# Altium schematic symbol library jlcpcb_2025_04_capacitors_extended_0201.schlib: 1175 symbols (part 3 of 7) (continued)
## FN03B221K500PLG
designator C?  Capacitance: 220pF  (hidden comment: *)
Capacitor, Ceramic (MLCC), 220pF, ±10%, 50V, X5R, ±10%, SMD 0201; Manufacturer: PSA(Prosperity Dielectrics); Manufacturer Part Number: FN03B221K500PLG; Package Size: 0201; JLCPCB Basic Part: No; JLCPCB Part Number: C565510; Supplier 1: LCSC; Category: Capacitors - MLCC; Supplier Part Number 1: C565510; Tolerance: ±10%; Voltage Rating: 50V; Temperature Coefficient: X5R; RoHS: Yes; ComponentLink1Description: Datasheet; ComponentLink2Description: JLCPCB Part URL; ComponentLink2URL: https://jlcpcb.com/partdetail/C565510; ComponentLink3Description: LCSC Part URL; ComponentLink3URL: https://lcsc.com/product-detail/Multilayer-Ceramic-Capacitors-MLCC---SMD-SMT_PSAProsperity-Dielectrics-PSAProsperity-Dielectrics-FN03B221K500PLG_C565510.html
footprint CAP-0201 (0201 (0603M) Capacitor)
pins: 1, 2

## FN03B331K160PLG
designator C?  Capacitance: 330pF  (hidden comment: *)
Capacitor, Ceramic (MLCC), 330pF, ±10%, 16V, X5R, ±10%, SMD 0201; Manufacturer: PSA(Prosperity Dielectrics); Manufacturer Part Number: FN03B331K160PLG; Package Size: 0201; JLCPCB Basic Part: No; JLCPCB Part Number: C565511; Supplier 1: LCSC; Category: Capacitors - MLCC; Supplier Part Number 1: C565511; Tolerance: ±10%; Voltage Rating: 16V; Temperature Coefficient: X5R; RoHS: Yes; ComponentLink1Description: Datasheet; ComponentLink2Description: JLCPCB Part URL; ComponentLink2URL: https://jlcpcb.com/partdetail/C565511; ComponentLink3Description: LCSC Part URL; ComponentLink3URL: https://lcsc.com/product-detail/Multilayer-Ceramic-Capacitors-MLCC---SMD-SMT_PSAProsperity-Dielectrics-PSAProsperity-Dielectrics-FN03B331K160PLG_C565511.html
footprint CAP-0201 (0201 (0603M) Capacitor)
pins: 1, 2

## FN03B331K250PLG
designator C?  Capacitance: 330pF  (hidden comment: *)
Capacitor, Ceramic (MLCC), 330pF, ±10%, 25V, X5R, ±10%, SMD 0201; Manufacturer: PSA(Prosperity Dielectrics); Manufacturer Part Number: FN03B331K250PLG; Package Size: 0201; JLCPCB Basic Part: No; JLCPCB Part Number: C565512; Supplier 1: LCSC; Category: Capacitors - MLCC; Supplier Part Number 1: C565512; Tolerance: ±10%; Voltage Rating: 25V; Temperature Coefficient: X5R; RoHS: Yes; ComponentLink1Description: Datasheet; ComponentLink2Description: JLCPCB Part URL; ComponentLink2URL: https://jlcpcb.com/partdetail/C565512; ComponentLink3Description: LCSC Part URL; ComponentLink3URL: https://lcsc.com/product-detail/Multilayer-Ceramic-Capacitors-MLCC---SMD-SMT_PSAProsperity-Dielectrics-PSAProsperity-Dielectrics-FN03B331K250PLG_C565512.html
footprint CAP-0201 (0201 (0603M) Capacitor)
pins: 1, 2

## FN03B331K500PLG
designator C?  Capacitance: 330pF  (hidden comment: *)
Capacitor, Ceramic (MLCC), 330pF, ±10%, 50V, X5R, ±10%, SMD 0201; Manufacturer: PSA(Prosperity Dielectrics); Manufacturer Part Number: FN03B331K500PLG; Package Size: 0201; JLCPCB Basic Part: No; JLCPCB Part Number: C565513; Supplier 1: LCSC; Category: Capacitors - MLCC; Supplier Part Number 1: C565513; Tolerance: ±10%; Voltage Rating: 50V; Temperature Coefficient: X5R; RoHS: Yes; ComponentLink1Description: Datasheet; ComponentLink2Description: JLCPCB Part URL; ComponentLink2URL: https://jlcpcb.com/partdetail/C565513; ComponentLink3Description: LCSC Part URL; ComponentLink3URL: https://lcsc.com/product-detail/Multilayer-Ceramic-Capacitors-MLCC---SMD-SMT_PSAProsperity-Dielectrics-PSAProsperity-Dielectrics-FN03B331K500PLG_C565513.html
footprint CAP-0201 (0201 (0603M) Capacitor)
pins: 1, 2

## FN03B332K100PLG
designator C?  Capacitance: 3.3nF  (hidden comment: *)
Capacitor, Ceramic (MLCC), 3.3nF, ±10%, 10V, ±10%, SMD 0201; Manufacturer: PSA(Prosperity Dielectrics); Manufacturer Part Number: FN03B332K100PLG; Package Size: 0201; JLCPCB Basic Part: No; JLCPCB Part Number: C565514; Supplier 1: LCSC; Category: Capacitors - MLCC; Supplier Part Number 1: C565514; Tolerance: ±10%; Voltage Rating: 10V; RoHS: Yes; ComponentLink1Description: Datasheet; ComponentLink2Description: JLCPCB Part URL; ComponentLink2URL: https://jlcpcb.com/partdetail/C565514; ComponentLink3Description: LCSC Part URL; ComponentLink3URL: https://lcsc.com/product-detail/Multilayer-Ceramic-Capacitors-MLCC---SMD-SMT_PSAProsperity-Dielectrics-PSAProsperity-Dielectrics-FN03B332K100PLG_C565514.html
footprint CAP-0201 (0201 (0603M) Capacitor)
pins: 1, 2

## FN03B332K160PLG
designator C?  Capacitance: 3.3nF  (hidden comment: *)
Capacitor, Ceramic (MLCC), 3.3nF, ±10%, 16V, ±10%, SMD 0201; Manufacturer: PSA(Prosperity Dielectrics); Manufacturer Part Number: FN03B332K160PLG; Package Size: 0201; JLCPCB Basic Part: No; JLCPCB Part Number: C565515; Supplier 1: LCSC; Category: Capacitors - MLCC; Supplier Part Number 1: C565515; Tolerance: ±10%; Voltage Rating: 16V; RoHS: Yes; ComponentLink1Description: Datasheet; ComponentLink2Description: JLCPCB Part URL; ComponentLink2URL: https://jlcpcb.com/partdetail/C565515; ComponentLink3Description: LCSC Part URL; ComponentLink3URL: https://lcsc.com/product-detail/Multilayer-Ceramic-Capacitors-MLCC---SMD-SMT_PSAProsperity-Dielectrics-PSAProsperity-Dielectrics-FN03B332K160PLG_C565515.html
footprint CAP-0201 (0201 (0603M) Capacitor)
pins: 1, 2

## FN03B333K100PLG
designator C?  Capacitance: 33nF  (hidden comment: *)
Capacitor, Ceramic (MLCC), 33nF, ±10%, 10V, ±10%, SMD 0201; Manufacturer: PSA(Prosperity Dielectrics); Manufacturer Part Number: FN03B333K100PLG; Package Size: 0201; JLCPCB Basic Part: No; JLCPCB Part Number: C565516; Supplier 1: LCSC; Category: Capacitors - MLCC; Supplier Part Number 1: C565516; Tolerance: ±10%; Voltage Rating: 10V; RoHS: Yes; ComponentLink1Description: Datasheet; ComponentLink2Description: JLCPCB Part URL; ComponentLink2URL: https://jlcpcb.com/partdetail/C565516; ComponentLink3Description: LCSC Part URL; ComponentLink3URL: https://lcsc.com/product-detail/Multilayer-Ceramic-Capacitors-MLCC---SMD-SMT_PSAProsperity-Dielectrics-PSAProsperity-Dielectrics-FN03B333K100PLG_C565516.html
footprint CAP-0201 (0201 (0603M) Capacitor)
pins: 1, 2

## FN03B471K160PLG
designator C?  Capacitance: 470pF  (hidden comment: *)
Capacitor, Ceramic (MLCC), 470pF, ±10%, 16V, X5R, ±10%, SMD 0201; Manufacturer: PSA(Prosperity Dielectrics); Manufacturer Part Number: FN03B471K160PLG; Package Size: 0201; JLCPCB Basic Part: No; JLCPCB Part Number: C565518; Supplier 1: LCSC; Category: Capacitors - MLCC; Supplier Part Number 1: C565518; Tolerance: ±10%; Voltage Rating: 16V; Temperature Coefficient: X5R; RoHS: Yes; ComponentLink1Description: Datasheet; ComponentLink2Description: JLCPCB Part URL; ComponentLink2URL: https://jlcpcb.com/partdetail/C565518; ComponentLink3Description: LCSC Part URL; ComponentLink3URL: https://lcsc.com/product-detail/Multilayer-Ceramic-Capacitors-MLCC---SMD-SMT_PSAProsperity-Dielectrics-PSAProsperity-Dielectrics-FN03B471K160PLG_C565518.html
footprint CAP-0201 (0201 (0603M) Capacitor)
pins: 1, 2

## FN03B471K250PLG
designator C?  Capacitance: 470pF  (hidden comment: *)
Capacitor, Ceramic (MLCC), 470pF, ±10%, 25V, X5R, ±10%, SMD 0201; Manufacturer: PSA(Prosperity Dielectrics); Manufacturer Part Number: FN03B471K250PLG; Package Size: 0201; JLCPCB Basic Part: No; JLCPCB Part Number: C565519; Supplier 1: LCSC; Category: Capacitors - MLCC; Supplier Part Number 1: C565519; Tolerance: ±10%; Voltage Rating: 25V; Temperature Coefficient: X5R; RoHS: Yes; ComponentLink1Description: Datasheet; ComponentLink2Description: JLCPCB Part URL; ComponentLink2URL: https://jlcpcb.com/partdetail/C565519; ComponentLink3Description: LCSC Part URL; ComponentLink3URL: https://lcsc.com/product-detail/Multilayer-Ceramic-Capacitors-MLCC---SMD-SMT_PSAProsperity-Dielectrics-PSAProsperity-Dielectrics-FN03B471K250PLG_C565519.html
footprint CAP-0201 (0201 (0603M) Capacitor)
pins: 1, 2

## FN03B471K500PLG
designator C?  Capacitance: 470pF  (hidden comment: *)
Capacitor, Ceramic (MLCC), 470pF, ±10%, 50V, X5R, ±10%, SMD 0201; Manufacturer: PSA(Prosperity Dielectrics); Manufacturer Part Number: FN03B471K500PLG; Package Size: 0201; JLCPCB Basic Part: No; JLCPCB Part Number: C565520; Supplier 1: LCSC; Category: Capacitors - MLCC; Supplier Part Number 1: C565520; Tolerance: ±10%; Voltage Rating: 50V; Temperature Coefficient: X5R; RoHS: Yes; ComponentLink1Description: Datasheet; ComponentLink2Description: JLCPCB Part URL; ComponentLink2URL: https://jlcpcb.com/partdetail/C565520; ComponentLink3Description: LCSC Part URL; ComponentLink3URL: https://lcsc.com/product-detail/Multilayer-Ceramic-Capacitors-MLCC---SMD-SMT_PSAProsperity-Dielectrics-PSAProsperity-Dielectrics-FN03B471K500PLG_C565520.html
footprint CAP-0201 (0201 (0603M) Capacitor)
pins: 1, 2

## FN03B472K100PLG
designator C?  Capacitance: 4.7nF  (hidden comment: *)
Capacitor, Ceramic (MLCC), 4.7nF, ±10%, 10V, X5R, ±10%, SMD 0201; Manufacturer: PSA(Prosperity Dielectrics); Manufacturer Part Number: FN03B472K100PLG; Package Size: 0201; JLCPCB Basic Part: No; JLCPCB Part Number: C565521; Supplier 1: LCSC; Category: Capacitors - MLCC; Supplier Part Number 1: C565521; Tolerance: ±10%; Voltage Rating: 10V; Temperature Coefficient: X5R; RoHS: Yes; ComponentLink1Description: Datasheet; ComponentLink2Description: JLCPCB Part URL; ComponentLink2URL: https://jlcpcb.com/partdetail/C565521; ComponentLink3Description: LCSC Part URL; ComponentLink3URL: https://lcsc.com/product-detail/Multilayer-Ceramic-Capacitors-MLCC---SMD-SMT_PSAProsperity-Dielectrics-PSAProsperity-Dielectrics-FN03B472K100PLG_C565521.html
footprint CAP-0201 (0201 (0603M) Capacitor)
pins: 1, 2

## FN03B472K160PLG
designator C?  Capacitance: 4.7nF  (hidden comment: *)
Capacitor, Ceramic (MLCC), 4.7nF, ±10%, 16V, X5R, ±10%, SMD 0201; Manufacturer: PSA(Prosperity Dielectrics); Manufacturer Part Number: FN03B472K160PLG; Package Size: 0201; JLCPCB Basic Part: No; JLCPCB Part Number: C565522; Supplier 1: LCSC; Category: Capacitors - MLCC; Supplier Part Number 1: C565522; Tolerance: ±10%; Voltage Rating: 16V; Temperature Coefficient: X5R; RoHS: Yes; ComponentLink1Description: Datasheet; ComponentLink2Description: JLCPCB Part URL; ComponentLink2URL: https://jlcpcb.com/partdetail/C565522; ComponentLink3Description: LCSC Part URL; ComponentLink3URL: https://lcsc.com/product-detail/Multilayer-Ceramic-Capacitors-MLCC---SMD-SMT_PSAProsperity-Dielectrics-PSAProsperity-Dielectrics-FN03B472K160PLG_C565522.html
footprint CAP-0201 (0201 (0603M) Capacitor)
pins: 1, 2

## FN03B472K250PLG
designator C?  Capacitance: 4.7nF  (hidden comment: *)
Capacitor, Ceramic (MLCC), 4.7nF, ±10%, 25V, X5R, ±10%, SMD 0201; Manufacturer: PSA(Prosperity Dielectrics); Manufacturer Part Number: FN03B472K250PLG; Package Size: 0201; JLCPCB Basic Part: No; JLCPCB Part Number: C565523; Supplier 1: LCSC; Category: Capacitors - MLCC; Supplier Part Number 1: C565523; Tolerance: ±10%; Voltage Rating: 25V; Temperature Coefficient: X5R; RoHS: Yes; ComponentLink1Description: Datasheet; ComponentLink2Description: JLCPCB Part URL; ComponentLink2URL: https://jlcpcb.com/partdetail/C565523; ComponentLink3Description: LCSC Part URL; ComponentLink3URL: https://lcsc.com/product-detail/Multilayer-Ceramic-Capacitors-MLCC---SMD-SMT_PSAProsperity-Dielectrics-PSAProsperity-Dielectrics-FN03B472K250PLG_C565523.html
footprint CAP-0201 (0201 (0603M) Capacitor)
pins: 1, 2

## FN03B473K6R3PLG
designator C?  Capacitance: 47nF  (hidden comment: *)
Capacitor, Ceramic (MLCC), 47nF, ±10%, 6.3V, ±10%, SMD 0201; Manufacturer: PSA(Prosperity Dielectrics); Manufacturer Part Number: FN03B473K6R3PLG; Package Size: 0201; JLCPCB Basic Part: No; JLCPCB Part Number: C565524; Supplier 1: LCSC; Category: Capacitors - MLCC; Supplier Part Number 1: C565524; Tolerance: ±10%; Voltage Rating: 6.3V; RoHS: Yes; ComponentLink1Description: Datasheet; ComponentLink2Description: JLCPCB Part URL; ComponentLink2URL: https://jlcpcb.com/partdetail/C565524; ComponentLink3Description: LCSC Part URL; ComponentLink3URL: https://lcsc.com/product-detail/Multilayer-Ceramic-Capacitors-MLCC---SMD-SMT_PSAProsperity-Dielectrics-PSAProsperity-Dielectrics-FN03B473K6R3PLG_C565524.html
footprint CAP-0201 (0201 (0603M) Capacitor)
pins: 1, 2

## FN03N1R0B500PLG
designator C?  Capacitance: 1pF  (hidden comment: *)
Capacitor, Ceramic (MLCC), 1pF, 50V, NP0, SMD 0201; Manufacturer: PSA(Prosperity Dielectrics); Manufacturer Part Number: FN03N1R0B500PLG; Package Size: 0201; JLCPCB Basic Part: No; JLCPCB Part Number: C565473; Supplier 1: LCSC; Category: Capacitors - MLCC; Supplier Part Number 1: C565473; Voltage Rating: 50V; Temperature Coefficient: NP0; RoHS: Yes; ComponentLink1Description: Datasheet; ComponentLink2Description: JLCPCB Part URL; ComponentLink2URL: https://jlcpcb.com/partdetail/C565473; ComponentLink3Description: LCSC Part URL; ComponentLink3URL: https://lcsc.com/product-detail/Multilayer-Ceramic-Capacitors-MLCC---SMD-SMT_PSAProsperity-Dielectrics-PSAProsperity-Dielectrics-FN03N1R0B500PLG_C565473.html
footprint CAP-0201 (0201 (0603M) Capacitor)
pins: 1, 2

## FN03N1R0C500PLG
designator C?  Capacitance: 1pF  (hidden comment: *)
Capacitor, Ceramic (MLCC), 1pF, 50V, C0G, SMD 0201; Manufacturer: PSA(Prosperity Dielectrics); Manufacturer Part Number: FN03N1R0C500PLG; Package Size: 0201; JLCPCB Basic Part: No; JLCPCB Part Number: C561698; Supplier 1: LCSC; Category: Capacitors - MLCC; Supplier Part Number 1: C561698; Voltage Rating: 50V; Temperature Coefficient: C0G; RoHS: Yes; ComponentLink1Description: Datasheet; ComponentLink2Description: JLCPCB Part URL; ComponentLink2URL: https://jlcpcb.com/partdetail/C561698; ComponentLink3Description: LCSC Part URL; ComponentLink3URL: https://lcsc.com/product-detail/Multilayer-Ceramic-Capacitors-MLCC---SMD-SMT_PSAProsperity-Dielectrics-PSAProsperity-Dielectrics-FN03N1R0C500PLG_C561698.html
footprint CAP-0201 (0201 (0603M) Capacitor)
pins: 1, 2

## FN03N1R2B500PLG
designator C?  Capacitance: 1.2pF  (hidden comment: *)
Capacitor, Ceramic (MLCC), 1.2pF, 50V, NP0, SMD 0201; Manufacturer: PSA(Prosperity Dielectrics); Manufacturer Part Number: FN03N1R2B500PLG; Package Size: 0201; JLCPCB Basic Part: No; JLCPCB Part Number: C565474; Supplier 1: LCSC; Category: Capacitors - MLCC; Supplier Part Number 1: C565474; Voltage Rating: 50V; Temperature Coefficient: NP0; RoHS: Yes; ComponentLink1Description: Datasheet; ComponentLink2Description: JLCPCB Part URL; ComponentLink2URL: https://jlcpcb.com/partdetail/C565474; ComponentLink3Description: LCSC Part URL; ComponentLink3URL: https://lcsc.com/product-detail/Multilayer-Ceramic-Capacitors-MLCC---SMD-SMT_PSAProsperity-Dielectrics-PSAProsperity-Dielectrics-FN03N1R2B500PLG_C565474.html
footprint CAP-0201 (0201 (0603M) Capacitor)
pins: 1, 2

## FN03N1R2C500PLG
designator C?  Capacitance: 1.2pF  (hidden comment: *)
Capacitor, Ceramic (MLCC), 1.2pF, 50V, C0G, SMD 0201; Manufacturer: PSA(Prosperity Dielectrics); Manufacturer Part Number: FN03N1R2C500PLG; Package Size: 0201; JLCPCB Basic Part: No; JLCPCB Part Number: C561699; Supplier 1: LCSC; Category: Capacitors - MLCC; Supplier Part Number 1: C561699; Voltage Rating: 50V; Temperature Coefficient: C0G; RoHS: Yes; ComponentLink1Description: Datasheet; ComponentLink2Description: JLCPCB Part URL; ComponentLink2URL: https://jlcpcb.com/partdetail/C561699; ComponentLink3Description: LCSC Part URL; ComponentLink3URL: https://lcsc.com/product-detail/Multilayer-Ceramic-Capacitors-MLCC---SMD-SMT_PSAProsperity-Dielectrics-PSAProsperity-Dielectrics-FN03N1R2C500PLG_C561699.html
footprint CAP-0201 (0201 (0603M) Capacitor)
pins: 1, 2

## FN03N1R5B500PLG
designator C?  Capacitance: 1.5pF  (hidden comment: *)
Capacitor, Ceramic (MLCC), 1.5pF, 50V, SMD 0201; Manufacturer: PSA(Prosperity Dielectrics); Manufacturer Part Number: FN03N1R5B500PLG; Package Size: 0201; JLCPCB Basic Part: No; JLCPCB Part Number: C565475; Supplier 1: LCSC; Category: Capacitors - MLCC; Supplier Part Number 1: C565475; Voltage Rating: 50V; RoHS: Yes; ComponentLink1Description: Datasheet; ComponentLink2Description: JLCPCB Part URL; ComponentLink2URL: https://jlcpcb.com/partdetail/C565475; ComponentLink3Description: LCSC Part URL; ComponentLink3URL: https://lcsc.com/product-detail/Multilayer-Ceramic-Capacitors-MLCC---SMD-SMT_PSAProsperity-Dielectrics-PSAProsperity-Dielectrics-FN03N1R5B500PLG_C565475.html
footprint CAP-0201 (0201 (0603M) Capacitor)
pins: 1, 2

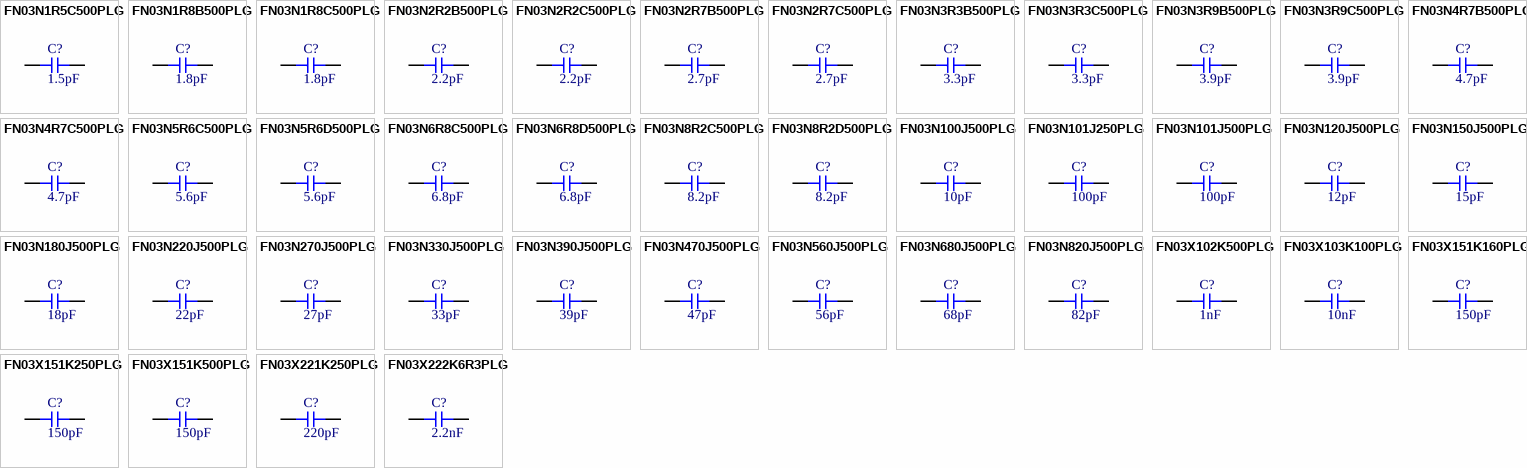
[diagram p12: symbols FN03N1R5C500PLG to FN03X222K6R3PLG]

## FN03N1R5C500PLG
designator C?  Capacitance: 1.5pF  (hidden comment: *)
Capacitor, Ceramic (MLCC), 1.5pF, 50V, NP0, SMD 0201; Manufacturer: PSA(Prosperity Dielectrics); Manufacturer Part Number: FN03N1R5C500PLG; Package Size: 0201; JLCPCB Basic Part: No; JLCPCB Part Number: C561700; Supplier 1: LCSC; Category: Capacitors - MLCC; Supplier Part Number 1: C561700; Voltage Rating: 50V; Temperature Coefficient: NP0; RoHS: Yes; ComponentLink1Description: Datasheet; ComponentLink2Description: JLCPCB Part URL; ComponentLink2URL: https://jlcpcb.com/partdetail/C561700; ComponentLink3Description: LCSC Part URL; ComponentLink3URL: https://lcsc.com/product-detail/Multilayer-Ceramic-Capacitors-MLCC---SMD-SMT_PSAProsperity-Dielectrics-PSAProsperity-Dielectrics-FN03N1R5C500PLG_C561700.html
footprint CAP-0201 (0201 (0603M) Capacitor)
pins: 1, 2

## FN03N1R8B500PLG
designator C?  Capacitance: 1.8pF  (hidden comment: *)
Capacitor, Ceramic (MLCC), 1.8pF, 50V, SMD 0201; Manufacturer: PSA(Prosperity Dielectrics); Manufacturer Part Number: FN03N1R8B500PLG; Package Size: 0201; JLCPCB Basic Part: No; JLCPCB Part Number: C565476; Supplier 1: LCSC; Category: Capacitors - MLCC; Supplier Part Number 1: C565476; Voltage Rating: 50V; RoHS: Yes; ComponentLink1Description: Datasheet; ComponentLink2Description: JLCPCB Part URL; ComponentLink2URL: https://jlcpcb.com/partdetail/C565476; ComponentLink3Description: LCSC Part URL; ComponentLink3URL: https://lcsc.com/product-detail/Multilayer-Ceramic-Capacitors-MLCC---SMD-SMT_PSAProsperity-Dielectrics-PSAProsperity-Dielectrics-FN03N1R8B500PLG_C565476.html
footprint CAP-0201 (0201 (0603M) Capacitor)
pins: 1, 2

## FN03N1R8C500PLG
designator C?  Capacitance: 1.8pF  (hidden comment: *)
Capacitor, Ceramic (MLCC), 1.8pF, 50V, C0G, SMD 0201; Manufacturer: PSA(Prosperity Dielectrics); Manufacturer Part Number: FN03N1R8C500PLG; Package Size: 0201; JLCPCB Basic Part: No; JLCPCB Part Number: C561701; Supplier 1: LCSC; Category: Capacitors - MLCC; Supplier Part Number 1: C561701; Voltage Rating: 50V; Temperature Coefficient: C0G; RoHS: Yes; ComponentLink1Description: Datasheet; ComponentLink2Description: JLCPCB Part URL; ComponentLink2URL: https://jlcpcb.com/partdetail/C561701; ComponentLink3Description: LCSC Part URL; ComponentLink3URL: https://lcsc.com/product-detail/Multilayer-Ceramic-Capacitors-MLCC---SMD-SMT_PSAProsperity-Dielectrics-PSAProsperity-Dielectrics-FN03N1R8C500PLG_C561701.html
footprint CAP-0201 (0201 (0603M) Capacitor)
pins: 1, 2

## FN03N2R2B500PLG
designator C?  Capacitance: 2.2pF  (hidden comment: *)
Capacitor, Ceramic (MLCC), 2.2pF, 50V, NP0, SMD 0201; Manufacturer: PSA(Prosperity Dielectrics); Manufacturer Part Number: FN03N2R2B500PLG; Package Size: 0201; JLCPCB Basic Part: No; JLCPCB Part Number: C565477; Supplier 1: LCSC; Category: Capacitors - MLCC; Supplier Part Number 1: C565477; Voltage Rating: 50V; Temperature Coefficient: NP0; RoHS: Yes; ComponentLink1Description: Datasheet; ComponentLink2Description: JLCPCB Part URL; ComponentLink2URL: https://jlcpcb.com/partdetail/C565477; ComponentLink3Description: LCSC Part URL; ComponentLink3URL: https://lcsc.com/product-detail/Multilayer-Ceramic-Capacitors-MLCC---SMD-SMT_PSAProsperity-Dielectrics-PSAProsperity-Dielectrics-FN03N2R2B500PLG_C565477.html
footprint CAP-0201 (0201 (0603M) Capacitor)
pins: 1, 2

## FN03N2R2C500PLG
designator C?  Capacitance: 2.2pF  (hidden comment: *)
Capacitor, Ceramic (MLCC), 2.2pF, 50V, NP0, SMD 0201; Manufacturer: PSA(Prosperity Dielectrics); Manufacturer Part Number: FN03N2R2C500PLG; Package Size: 0201; JLCPCB Basic Part: No; JLCPCB Part Number: C561702; Supplier 1: LCSC; Category: Capacitors - MLCC; Supplier Part Number 1: C561702; Voltage Rating: 50V; Temperature Coefficient: NP0; RoHS: Yes; ComponentLink1Description: Datasheet; ComponentLink2Description: JLCPCB Part URL; ComponentLink2URL: https://jlcpcb.com/partdetail/C561702; ComponentLink3Description: LCSC Part URL; ComponentLink3URL: https://lcsc.com/product-detail/Multilayer-Ceramic-Capacitors-MLCC---SMD-SMT_PSAProsperity-Dielectrics-PSAProsperity-Dielectrics-FN03N2R2C500PLG_C561702.html
footprint CAP-0201 (0201 (0603M) Capacitor)
pins: 1, 2

## FN03N2R7B500PLG
designator C?  Capacitance: 2.7pF  (hidden comment: *)
Capacitor, Ceramic (MLCC), 2.7pF, 50V, C0G, SMD 0201; Manufacturer: PSA(Prosperity Dielectrics); Manufacturer Part Number: FN03N2R7B500PLG; Package Size: 0201; JLCPCB Basic Part: No; JLCPCB Part Number: C565478; Supplier 1: LCSC; Category: Capacitors - MLCC; Supplier Part Number 1: C565478; Voltage Rating: 50V; Temperature Coefficient: C0G; RoHS: Yes; ComponentLink1Description: Datasheet; ComponentLink2Description: JLCPCB Part URL; ComponentLink2URL: https://jlcpcb.com/partdetail/C565478; ComponentLink3Description: LCSC Part URL; ComponentLink3URL: https://lcsc.com/product-detail/Multilayer-Ceramic-Capacitors-MLCC---SMD-SMT_PSAProsperity-Dielectrics-PSAProsperity-Dielectrics-FN03N2R7B500PLG_C565478.html
footprint CAP-0201 (0201 (0603M) Capacitor)
pins: 1, 2

## FN03N2R7C500PLG
designator C?  Capacitance: 2.7pF  (hidden comment: *)
Capacitor, Ceramic (MLCC), 2.7pF, 50V, C0G, SMD 0201; Manufacturer: PSA(Prosperity Dielectrics); Manufacturer Part Number: FN03N2R7C500PLG; Package Size: 0201; JLCPCB Basic Part: No; JLCPCB Part Number: C561703; Supplier 1: LCSC; Category: Capacitors - MLCC; Supplier Part Number 1: C561703; Voltage Rating: 50V; Temperature Coefficient: C0G; RoHS: Yes; ComponentLink1Description: Datasheet; ComponentLink2Description: JLCPCB Part URL; ComponentLink2URL: https://jlcpcb.com/partdetail/C561703; ComponentLink3Description: LCSC Part URL; ComponentLink3URL: https://lcsc.com/product-detail/Multilayer-Ceramic-Capacitors-MLCC---SMD-SMT_PSAProsperity-Dielectrics-PSAProsperity-Dielectrics-FN03N2R7C500PLG_C561703.html
footprint CAP-0201 (0201 (0603M) Capacitor)
pins: 1, 2

## FN03N3R3B500PLG
designator C?  Capacitance: 3.3pF  (hidden comment: *)
Capacitor, Ceramic (MLCC), 3.3pF, 50V, C0G, SMD 0201; Manufacturer: PSA(Prosperity Dielectrics); Manufacturer Part Number: FN03N3R3B500PLG; Package Size: 0201; JLCPCB Basic Part: No; JLCPCB Part Number: C565479; Supplier 1: LCSC; Category: Capacitors - MLCC; Supplier Part Number 1: C565479; Voltage Rating: 50V; Temperature Coefficient: C0G; RoHS: Yes; ComponentLink1Description: Datasheet; ComponentLink2Description: JLCPCB Part URL; ComponentLink2URL: https://jlcpcb.com/partdetail/C565479; ComponentLink3Description: LCSC Part URL; ComponentLink3URL: https://lcsc.com/product-detail/Multilayer-Ceramic-Capacitors-MLCC---SMD-SMT_PSAProsperity-Dielectrics-PSAProsperity-Dielectrics-FN03N3R3B500PLG_C565479.html
footprint CAP-0201 (0201 (0603M) Capacitor)
pins: 1, 2

## FN03N3R3C500PLG
designator C?  Capacitance: 3.3pF  (hidden comment: *)
Capacitor, Ceramic (MLCC), 3.3pF, 50V, C0G, SMD 0201; Manufacturer: PSA(Prosperity Dielectrics); Manufacturer Part Number: FN03N3R3C500PLG; Package Size: 0201; JLCPCB Basic Part: No; JLCPCB Part Number: C561704; Supplier 1: LCSC; Category: Capacitors - MLCC; Supplier Part Number 1: C561704; Voltage Rating: 50V; Temperature Coefficient: C0G; RoHS: Yes; ComponentLink1Description: Datasheet; ComponentLink2Description: JLCPCB Part URL; ComponentLink2URL: https://jlcpcb.com/partdetail/C561704; ComponentLink3Description: LCSC Part URL; ComponentLink3URL: https://lcsc.com/product-detail/Multilayer-Ceramic-Capacitors-MLCC---SMD-SMT_PSAProsperity-Dielectrics-PSAProsperity-Dielectrics-FN03N3R3C500PLG_C561704.html
footprint CAP-0201 (0201 (0603M) Capacitor)
pins: 1, 2

## FN03N3R9B500PLG
designator C?  Capacitance: 3.9pF  (hidden comment: *)
Capacitor, Ceramic (MLCC), 3.9pF, 50V, SMD 0201; Manufacturer: PSA(Prosperity Dielectrics); Manufacturer Part Number: FN03N3R9B500PLG; Package Size: 0201; JLCPCB Basic Part: No; JLCPCB Part Number: C565480; Supplier 1: LCSC; Category: Capacitors - MLCC; Supplier Part Number 1: C565480; Voltage Rating: 50V; RoHS: Yes; ComponentLink1Description: Datasheet; ComponentLink2Description: JLCPCB Part URL; ComponentLink2URL: https://jlcpcb.com/partdetail/C565480; ComponentLink3Description: LCSC Part URL; ComponentLink3URL: https://lcsc.com/product-detail/Multilayer-Ceramic-Capacitors-MLCC---SMD-SMT_PSAProsperity-Dielectrics-PSAProsperity-Dielectrics-FN03N3R9B500PLG_C565480.html
footprint CAP-0201 (0201 (0603M) Capacitor)
pins: 1, 2

## FN03N3R9C500PLG
designator C?  Capacitance: 3.9pF  (hidden comment: *)
Capacitor, Ceramic (MLCC), 3.9pF, 50V, SMD 0201; Manufacturer: PSA(Prosperity Dielectrics); Manufacturer Part Number: FN03N3R9C500PLG; Package Size: 0201; JLCPCB Basic Part: No; JLCPCB Part Number: C561705; Supplier 1: LCSC; Category: Capacitors - MLCC; Supplier Part Number 1: C561705; Voltage Rating: 50V; RoHS: Yes; ComponentLink1Description: Datasheet; ComponentLink2Description: JLCPCB Part URL; ComponentLink2URL: https://jlcpcb.com/partdetail/C561705; ComponentLink3Description: LCSC Part URL; ComponentLink3URL: https://lcsc.com/product-detail/Multilayer-Ceramic-Capacitors-MLCC---SMD-SMT_PSAProsperity-Dielectrics-PSAProsperity-Dielectrics-FN03N3R9C500PLG_C561705.html
footprint CAP-0201 (0201 (0603M) Capacitor)
pins: 1, 2

## FN03N4R7B500PLG
designator C?  Capacitance: 4.7pF  (hidden comment: *)
Capacitor, Ceramic (MLCC), 4.7pF, 50V, SMD 0201; Manufacturer: PSA(Prosperity Dielectrics); Manufacturer Part Number: FN03N4R7B500PLG; Package Size: 0201; JLCPCB Basic Part: No; JLCPCB Part Number: C565481; Supplier 1: LCSC; Category: Capacitors - MLCC; Supplier Part Number 1: C565481; Voltage Rating: 50V; RoHS: Yes; ComponentLink1Description: Datasheet; ComponentLink2Description: JLCPCB Part URL; ComponentLink2URL: https://jlcpcb.com/partdetail/C565481; ComponentLink3Description: LCSC Part URL; ComponentLink3URL: https://lcsc.com/product-detail/Multilayer-Ceramic-Capacitors-MLCC---SMD-SMT_PSAProsperity-Dielectrics-PSAProsperity-Dielectrics-FN03N4R7B500PLG_C565481.html
footprint CAP-0201 (0201 (0603M) Capacitor)
pins: 1, 2

## FN03N4R7C500PLG
designator C?  Capacitance: 4.7pF  (hidden comment: *)
Capacitor, Ceramic (MLCC), 4.7pF, 50V, C0G, SMD 0201; Manufacturer: PSA(Prosperity Dielectrics); Manufacturer Part Number: FN03N4R7C500PLG; Package Size: 0201; JLCPCB Basic Part: No; JLCPCB Part Number: C561706; Supplier 1: LCSC; Category: Capacitors - MLCC; Supplier Part Number 1: C561706; Voltage Rating: 50V; Temperature Coefficient: C0G; RoHS: Yes; ComponentLink1Description: Datasheet; ComponentLink2Description: JLCPCB Part URL; ComponentLink2URL: https://jlcpcb.com/partdetail/C561706; ComponentLink3Description: LCSC Part URL; ComponentLink3URL: https://lcsc.com/product-detail/Multilayer-Ceramic-Capacitors-MLCC---SMD-SMT_PSAProsperity-Dielectrics-PSAProsperity-Dielectrics-FN03N4R7C500PLG_C561706.html
footprint CAP-0201 (0201 (0603M) Capacitor)
pins: 1, 2

## FN03N5R6C500PLG
designator C?  Capacitance: 5.6pF  (hidden comment: *)
Capacitor, Ceramic (MLCC), 5.6pF, 50V, C0G, SMD 0201; Manufacturer: PSA(Prosperity Dielectrics); Manufacturer Part Number: FN03N5R6C500PLG; Package Size: 0201; JLCPCB Basic Part: No; JLCPCB Part Number: C565482; Supplier 1: LCSC; Category: Capacitors - MLCC; Supplier Part Number 1: C565482; Voltage Rating: 50V; Temperature Coefficient: C0G; RoHS: Yes; ComponentLink1Description: Datasheet; ComponentLink2Description: JLCPCB Part URL; ComponentLink2URL: https://jlcpcb.com/partdetail/C565482; ComponentLink3Description: LCSC Part URL; ComponentLink3URL: https://lcsc.com/product-detail/Multilayer-Ceramic-Capacitors-MLCC---SMD-SMT_PSAProsperity-Dielectrics-PSAProsperity-Dielectrics-FN03N5R6C500PLG_C565482.html
footprint CAP-0201 (0201 (0603M) Capacitor)
pins: 1, 2

## FN03N5R6D500PLG
designator C?  Capacitance: 5.6pF  (hidden comment: *)
Capacitor, Ceramic (MLCC), 5.6pF, 50V, NP0, SMD 0201; Manufacturer: PSA(Prosperity Dielectrics); Manufacturer Part Number: FN03N5R6D500PLG; Package Size: 0201; JLCPCB Basic Part: No; JLCPCB Part Number: C561707; Supplier 1: LCSC; Category: Capacitors - MLCC; Supplier Part Number 1: C561707; Voltage Rating: 50V; Temperature Coefficient: NP0; RoHS: Yes; ComponentLink1Description: Datasheet; ComponentLink2Description: JLCPCB Part URL; ComponentLink2URL: https://jlcpcb.com/partdetail/C561707; ComponentLink3Description: LCSC Part URL; ComponentLink3URL: https://lcsc.com/product-detail/Multilayer-Ceramic-Capacitors-MLCC---SMD-SMT_PSAProsperity-Dielectrics-PSAProsperity-Dielectrics-FN03N5R6D500PLG_C561707.html
footprint CAP-0201 (0201 (0603M) Capacitor)
pins: 1, 2

## FN03N6R8C500PLG
designator C?  Capacitance: 6.8pF  (hidden comment: *)
Capacitor, Ceramic (MLCC), 6.8pF, 50V, C0G, SMD 0201; Manufacturer: PSA(Prosperity Dielectrics); Manufacturer Part Number: FN03N6R8C500PLG; Package Size: 0201; JLCPCB Basic Part: No; JLCPCB Part Number: C565483; Supplier 1: LCSC; Category: Capacitors - MLCC; Supplier Part Number 1: C565483; Voltage Rating: 50V; Temperature Coefficient: C0G; RoHS: Yes; ComponentLink1Description: Datasheet; ComponentLink2Description: JLCPCB Part URL; ComponentLink2URL: https://jlcpcb.com/partdetail/C565483; ComponentLink3Description: LCSC Part URL; ComponentLink3URL: https://lcsc.com/product-detail/Multilayer-Ceramic-Capacitors-MLCC---SMD-SMT_PSAProsperity-Dielectrics-PSAProsperity-Dielectrics-FN03N6R8C500PLG_C565483.html
footprint CAP-0201 (0201 (0603M) Capacitor)
pins: 1, 2

## FN03N6R8D500PLG
designator C?  Capacitance: 6.8pF  (hidden comment: *)
Capacitor, Ceramic (MLCC), 6.8pF, 50V, C0G, SMD 0201; Manufacturer: PSA(Prosperity Dielectrics); Manufacturer Part Number: FN03N6R8D500PLG; Package Size: 0201; JLCPCB Basic Part: No; JLCPCB Part Number: C561708; Supplier 1: LCSC; Category: Capacitors - MLCC; Supplier Part Number 1: C561708; Voltage Rating: 50V; Temperature Coefficient: C0G; RoHS: Yes; ComponentLink1Description: Datasheet; ComponentLink2Description: JLCPCB Part URL; ComponentLink2URL: https://jlcpcb.com/partdetail/C561708; ComponentLink3Description: LCSC Part URL; ComponentLink3URL: https://lcsc.com/product-detail/Multilayer-Ceramic-Capacitors-MLCC---SMD-SMT_PSAProsperity-Dielectrics-PSAProsperity-Dielectrics-FN03N6R8D500PLG_C561708.html
footprint CAP-0201 (0201 (0603M) Capacitor)
pins: 1, 2

## FN03N8R2C500PLG
designator C?  Capacitance: 8.2pF  (hidden comment: *)
Capacitor, Ceramic (MLCC), 8.2pF, 50V, C0G, SMD 0201; Manufacturer: PSA(Prosperity Dielectrics); Manufacturer Part Number: FN03N8R2C500PLG; Package Size: 0201; JLCPCB Basic Part: No; JLCPCB Part Number: C565484; Supplier 1: LCSC; Category: Capacitors - MLCC; Supplier Part Number 1: C565484; Voltage Rating: 50V; Temperature Coefficient: C0G; RoHS: Yes; ComponentLink1Description: Datasheet; ComponentLink2Description: JLCPCB Part URL; ComponentLink2URL: https://jlcpcb.com/partdetail/C565484; ComponentLink3Description: LCSC Part URL; ComponentLink3URL: https://lcsc.com/product-detail/Multilayer-Ceramic-Capacitors-MLCC---SMD-SMT_PSAProsperity-Dielectrics-PSAProsperity-Dielectrics-FN03N8R2C500PLG_C565484.html
footprint CAP-0201 (0201 (0603M) Capacitor)
pins: 1, 2

## FN03N8R2D500PLG
designator C?  Capacitance: 8.2pF  (hidden comment: *)
Capacitor, Ceramic (MLCC), 8.2pF, 50V, C0G, SMD 0201; Manufacturer: PSA(Prosperity Dielectrics); Manufacturer Part Number: FN03N8R2D500PLG; Package Size: 0201; JLCPCB Basic Part: No; JLCPCB Part Number: C561709; Supplier 1: LCSC; Category: Capacitors - MLCC; Supplier Part Number 1: C561709; Voltage Rating: 50V; Temperature Coefficient: C0G; RoHS: Yes; ComponentLink1Description: Datasheet; ComponentLink2Description: JLCPCB Part URL; ComponentLink2URL: https://jlcpcb.com/partdetail/C561709; ComponentLink3Description: LCSC Part URL; ComponentLink3URL: https://lcsc.com/product-detail/Multilayer-Ceramic-Capacitors-MLCC---SMD-SMT_PSAProsperity-Dielectrics-PSAProsperity-Dielectrics-FN03N8R2D500PLG_C561709.html
footprint CAP-0201 (0201 (0603M) Capacitor)
pins: 1, 2

## FN03N100J500PLG
designator C?  Capacitance: 10pF  (hidden comment: *)
Capacitor, Ceramic (MLCC), 10pF, ±5%, 50V, ±5%, SMD 0201; Manufacturer: PSA(Prosperity Dielectrics); Manufacturer Part Number: FN03N100J500PLG; Package Size: 0201; JLCPCB Basic Part: No; JLCPCB Part Number: C561710; Supplier 1: LCSC; Category: Capacitors - MLCC; Supplier Part Number 1: C561710; Tolerance: ±5%; Voltage Rating: 50V; RoHS: Yes; ComponentLink1Description: Datasheet; ComponentLink2Description: JLCPCB Part URL; ComponentLink2URL: https://jlcpcb.com/partdetail/C561710; ComponentLink3Description: LCSC Part URL; ComponentLink3URL: https://lcsc.com/product-detail/Multilayer-Ceramic-Capacitors-MLCC---SMD-SMT_PSAProsperity-Dielectrics-PSAProsperity-Dielectrics-FN03N100J500PLG_C561710.html
footprint CAP-0201 (0201 (0603M) Capacitor)
pins: 1, 2

## FN03N101J250PLG
designator C?  Capacitance: 100pF  (hidden comment: *)
Capacitor, Ceramic (MLCC), 100pF, ±5%, 25V, C0G, ±5%, SMD 0201; Manufacturer: PSA(Prosperity Dielectrics); Manufacturer Part Number: FN03N101J250PLG; Package Size: 0201; JLCPCB Basic Part: No; JLCPCB Part Number: C525192; Supplier 1: LCSC; Category: Capacitors - MLCC; Supplier Part Number 1: C525192; Tolerance: ±5%; Voltage Rating: 25V; Temperature Coefficient: C0G; RoHS: Yes; ComponentLink1Description: Datasheet; ComponentLink1URL: https://wmsc.lcsc.com/wmsc/upload/file/pdf/v2/lcsc/2304140030_PSA-Prosperity-Dielectrics-FN03N101J250PLG_C525192.pdf; ComponentLink2Description: JLCPCB Part URL; ComponentLink2URL: https://jlcpcb.com/partdetail/C525192; ComponentLink3Description: LCSC Part URL; ComponentLink3URL: https://lcsc.com/product-detail/Multilayer-Ceramic-Capacitors-MLCC---SMD-SMT_PSAProsperity-Dielectrics-PSAProsperity-Dielectrics-FN03N101J250PLG_C525192.html
footprint CAP-0201 (0201 (0603M) Capacitor)
pins: 1, 2

## FN03N101J500PLG
designator C?  Capacitance: 100pF  (hidden comment: *)
Capacitor, Ceramic (MLCC), 100pF, ±5%, 50V, ±5%, SMD 0201; Manufacturer: PSA(Prosperity Dielectrics); Manufacturer Part Number: FN03N101J500PLG; Package Size: 0201; JLCPCB Basic Part: No; JLCPCB Part Number: C561711; Supplier 1: LCSC; Category: Capacitors - MLCC; Supplier Part Number 1: C561711; Tolerance: ±5%; Voltage Rating: 50V; RoHS: Yes; ComponentLink1Description: Datasheet; ComponentLink2Description: JLCPCB Part URL; ComponentLink2URL: https://jlcpcb.com/partdetail/C561711; ComponentLink3Description: LCSC Part URL; ComponentLink3URL: https://lcsc.com/product-detail/Multilayer-Ceramic-Capacitors-MLCC---SMD-SMT_PSAProsperity-Dielectrics-PSAProsperity-Dielectrics-FN03N101J500PLG_C561711.html
footprint CAP-0201 (0201 (0603M) Capacitor)
pins: 1, 2

## FN03N120J500PLG
designator C?  Capacitance: 12pF  (hidden comment: *)
Capacitor, Ceramic (MLCC), 12pF, ±5%, 50V, C0G, ±5%, SMD 0201; Manufacturer: PSA(Prosperity Dielectrics); Manufacturer Part Number: FN03N120J500PLG; Package Size: 0201; JLCPCB Basic Part: No; JLCPCB Part Number: C561712; Supplier 1: LCSC; Category: Capacitors - MLCC; Supplier Part Number 1: C561712; Tolerance: ±5%; Voltage Rating: 50V; Temperature Coefficient: C0G; RoHS: Yes; ComponentLink1Description: Datasheet; ComponentLink2Description: JLCPCB Part URL; ComponentLink2URL: https://jlcpcb.com/partdetail/C561712; ComponentLink3Description: LCSC Part URL; ComponentLink3URL: https://lcsc.com/product-detail/Multilayer-Ceramic-Capacitors-MLCC---SMD-SMT_PSAProsperity-Dielectrics-PSAProsperity-Dielectrics-FN03N120J500PLG_C561712.html
footprint CAP-0201 (0201 (0603M) Capacitor)
pins: 1, 2

## FN03N150J500PLG
designator C?  Capacitance: 15pF  (hidden comment: *)
Capacitor, Ceramic (MLCC), 15pF, ±5%, 50V, NP0, ±5%, SMD 0201; Manufacturer: PSA(Prosperity Dielectrics); Manufacturer Part Number: FN03N150J500PLG; Package Size: 0201; JLCPCB Basic Part: No; JLCPCB Part Number: C561713; Supplier 1: LCSC; Category: Capacitors - MLCC; Supplier Part Number 1: C561713; Tolerance: ±5%; Voltage Rating: 50V; Temperature Coefficient: NP0; RoHS: Yes; ComponentLink1Description: Datasheet; ComponentLink2Description: JLCPCB Part URL; ComponentLink2URL: https://jlcpcb.com/partdetail/C561713; ComponentLink3Description: LCSC Part URL; ComponentLink3URL: https://lcsc.com/product-detail/Multilayer-Ceramic-Capacitors-MLCC---SMD-SMT_PSAProsperity-Dielectrics-PSAProsperity-Dielectrics-FN03N150J500PLG_C561713.html
footprint CAP-0201 (0201 (0603M) Capacitor)
pins: 1, 2

## FN03N180J500PLG
designator C?  Capacitance: 18pF  (hidden comment: *)
Capacitor, Ceramic (MLCC), 18pF, ±5%, 50V, ±5%, SMD 0201; Manufacturer: PSA(Prosperity Dielectrics); Manufacturer Part Number: FN03N180J500PLG; Package Size: 0201; JLCPCB Basic Part: No; JLCPCB Part Number: C561714; Supplier 1: LCSC; Category: Capacitors - MLCC; Supplier Part Number 1: C561714; Tolerance: ±5%; Voltage Rating: 50V; RoHS: Yes; ComponentLink1Description: Datasheet; ComponentLink2Description: JLCPCB Part URL; ComponentLink2URL: https://jlcpcb.com/partdetail/C561714; ComponentLink3Description: LCSC Part URL; ComponentLink3URL: https://lcsc.com/product-detail/Multilayer-Ceramic-Capacitors-MLCC---SMD-SMT_PSAProsperity-Dielectrics-PSAProsperity-Dielectrics-FN03N180J500PLG_C561714.html
footprint CAP-0201 (0201 (0603M) Capacitor)
pins: 1, 2

## FN03N220J500PLG
designator C?  Capacitance: 22pF  (hidden comment: *)
Capacitor, Ceramic (MLCC), 22pF, ±5%, 50V, C0G, ±5%, SMD 0201; Manufacturer: PSA(Prosperity Dielectrics); Manufacturer Part Number: FN03N220J500PLG; Package Size: 0201; JLCPCB Basic Part: No; JLCPCB Part Number: C561715; Supplier 1: LCSC; Category: Capacitors - MLCC; Supplier Part Number 1: C561715; Tolerance: ±5%; Voltage Rating: 50V; Temperature Coefficient: C0G; RoHS: Yes; ComponentLink1Description: Datasheet; ComponentLink2Description: JLCPCB Part URL; ComponentLink2URL: https://jlcpcb.com/partdetail/C561715; ComponentLink3Description: LCSC Part URL; ComponentLink3URL: https://lcsc.com/product-detail/Multilayer-Ceramic-Capacitors-MLCC---SMD-SMT_PSAProsperity-Dielectrics-PSAProsperity-Dielectrics-FN03N220J500PLG_C561715.html
footprint CAP-0201 (0201 (0603M) Capacitor)
pins: 1, 2

## FN03N270J500PLG
designator C?  Capacitance: 27pF  (hidden comment: *)
Capacitor, Ceramic (MLCC), 27pF, ±5%, 50V, C0G, ±5%, SMD 0201; Manufacturer: PSA(Prosperity Dielectrics); Manufacturer Part Number: FN03N270J500PLG; Package Size: 0201; JLCPCB Basic Part: No; JLCPCB Part Number: C561716; Supplier 1: LCSC; Category: Capacitors - MLCC; Supplier Part Number 1: C561716; Tolerance: ±5%; Voltage Rating: 50V; Temperature Coefficient: C0G; RoHS: Yes; ComponentLink1Description: Datasheet; ComponentLink2Description: JLCPCB Part URL; ComponentLink2URL: https://jlcpcb.com/partdetail/C561716; ComponentLink3Description: LCSC Part URL; ComponentLink3URL: https://lcsc.com/product-detail/Multilayer-Ceramic-Capacitors-MLCC---SMD-SMT_PSAProsperity-Dielectrics-PSAProsperity-Dielectrics-FN03N270J500PLG_C561716.html
footprint CAP-0201 (0201 (0603M) Capacitor)
pins: 1, 2

## FN03N330J500PLG
designator C?  Capacitance: 33pF  (hidden comment: *)
Capacitor, Ceramic (MLCC), 33pF, ±5%, 50V, NP0, ±5%, SMD 0201; Manufacturer: PSA(Prosperity Dielectrics); Manufacturer Part Number: FN03N330J500PLG; Package Size: 0201; JLCPCB Basic Part: No; JLCPCB Part Number: C561717; Supplier 1: LCSC; Category: Capacitors - MLCC; Supplier Part Number 1: C561717; Tolerance: ±5%; Voltage Rating: 50V; Temperature Coefficient: NP0; RoHS: Yes; ComponentLink1Description: Datasheet; ComponentLink2Description: JLCPCB Part URL; ComponentLink2URL: https://jlcpcb.com/partdetail/C561717; ComponentLink3Description: LCSC Part URL; ComponentLink3URL: https://lcsc.com/product-detail/Multilayer-Ceramic-Capacitors-MLCC---SMD-SMT_PSAProsperity-Dielectrics-PSAProsperity-Dielectrics-FN03N330J500PLG_C561717.html
footprint CAP-0201 (0201 (0603M) Capacitor)
pins: 1, 2

## FN03N390J500PLG
designator C?  Capacitance: 39pF  (hidden comment: *)
Capacitor, Ceramic (MLCC), 39pF, ±5%, 50V, C0G, ±5%, SMD 0201; Manufacturer: PSA(Prosperity Dielectrics); Manufacturer Part Number: FN03N390J500PLG; Package Size: 0201; JLCPCB Basic Part: No; JLCPCB Part Number: C561718; Supplier 1: LCSC; Category: Capacitors - MLCC; Supplier Part Number 1: C561718; Tolerance: ±5%; Voltage Rating: 50V; Temperature Coefficient: C0G; RoHS: Yes; ComponentLink1Description: Datasheet; ComponentLink2Description: JLCPCB Part URL; ComponentLink2URL: https://jlcpcb.com/partdetail/C561718; ComponentLink3Description: LCSC Part URL; ComponentLink3URL: https://lcsc.com/product-detail/Multilayer-Ceramic-Capacitors-MLCC---SMD-SMT_PSAProsperity-Dielectrics-PSAProsperity-Dielectrics-FN03N390J500PLG_C561718.html
footprint CAP-0201 (0201 (0603M) Capacitor)
pins: 1, 2
